# Altium footprint library Kon_Tipk.PCBLIB: 113 footprints (part 4 of 8)
Each footprint in its own frame and in the unit in brackets; x right, y up, seen from the top. Pads: shape width x height; smd on the part's side, far side on the other; paste and mask are expansions set on the pad; w line width, h text height; cw(c..) or ccw(c..) is an arc to the next point about the centre after c.
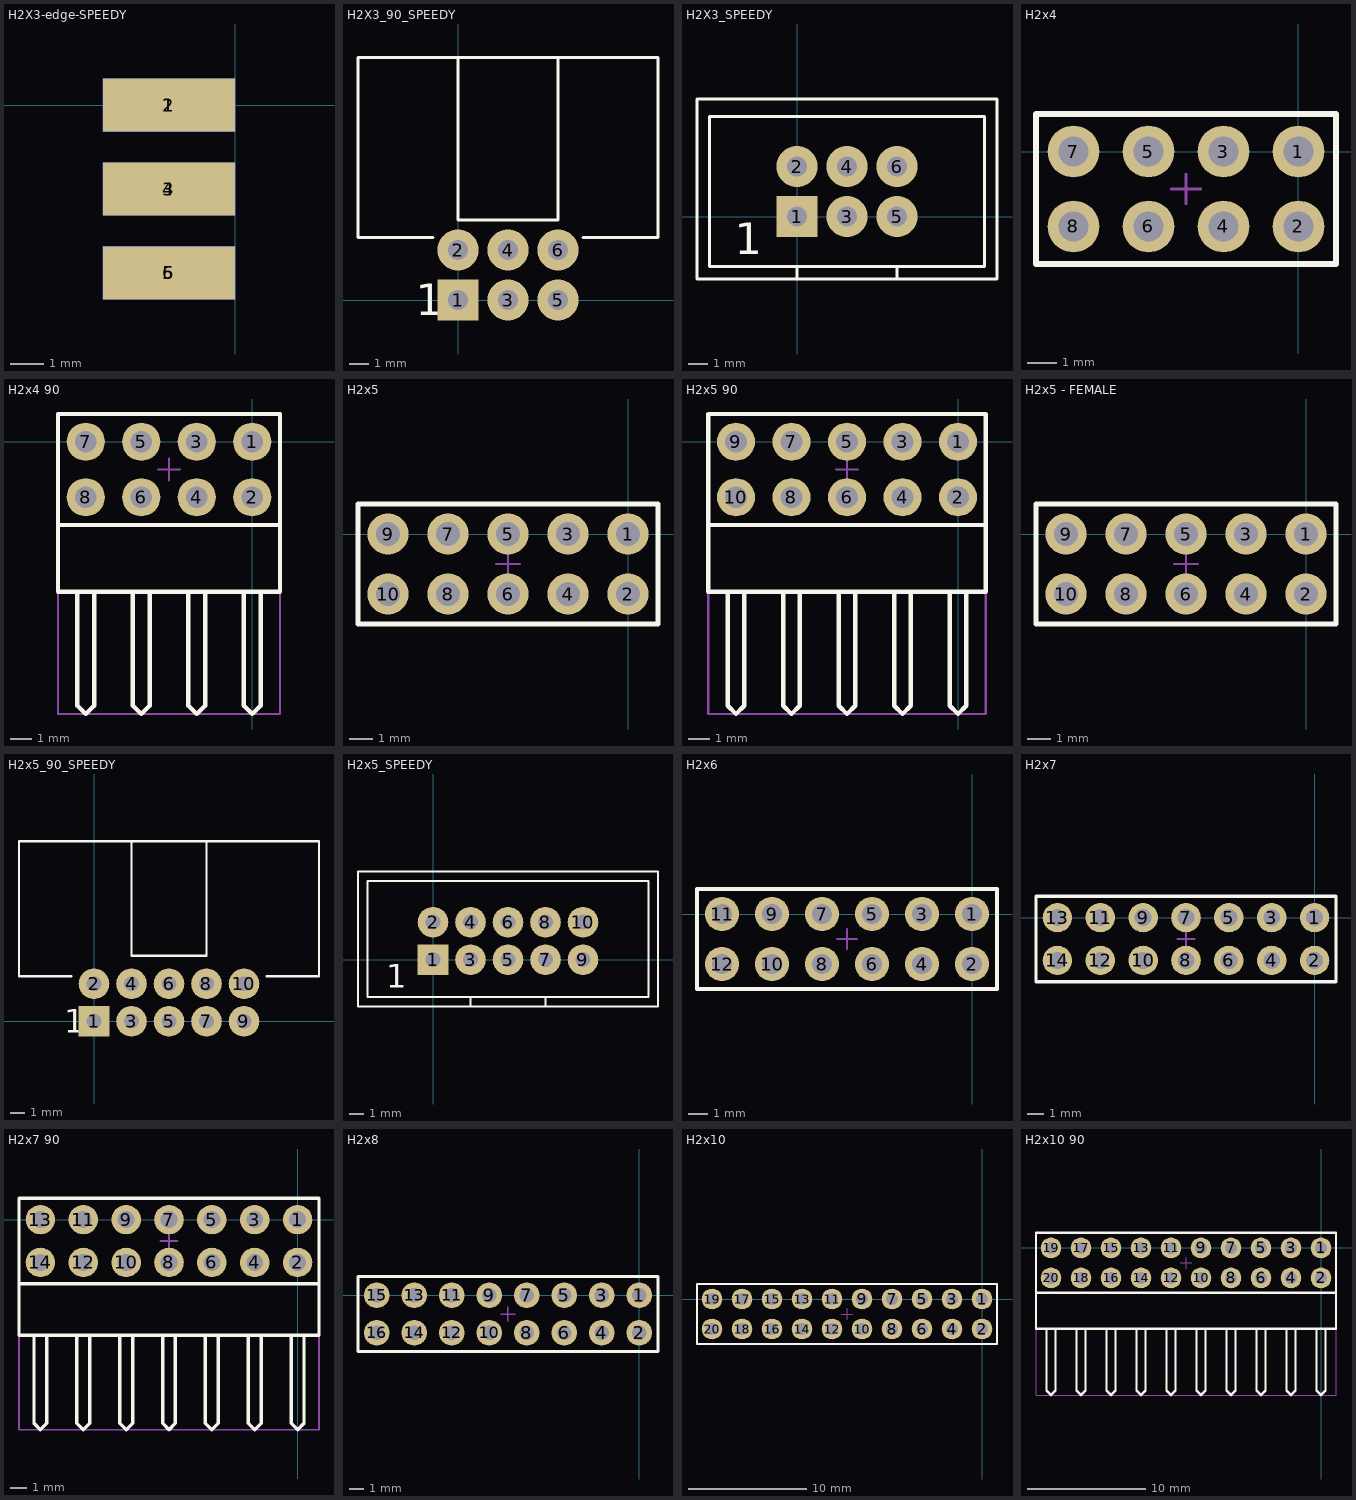
[diagram p3: the footprints below, top view; thin cyan lines are the x and y axes]

## H2X3-edge-SPEEDY [mm]
pads (6):
  rect 4x1.6 smd: 1(-2,0) 3(-2,-2.54) 5(-2,-5.08)
  rect 4x1.6 smd far side: 2(-2,0) 4(-2,-2.54) 6(-2,-5.08)
3D body "0918_SEK_low_profile_male_header_straight_6-pin_2_9_PCB.stp": height 3.52, standoff -5.68, extent -3.633,-10.16 9.017,5.08

## H2X3_90_SPEEDY [mil]
pads (6):
  rect 82x82 hole 39.37: 1(0,0)
  round 82 hole 39.37: 2(0,100) 3(100,0) 4(100,100) 5(200,0) 6(200,100)
Top Overlay:
  lines w5.91: -50,125 -200,125 -200,485 400,485 400,125 250,125 ; 0,485 0,160 200,160 200,485
  text "1" at -85,-30 h62.5
3D body "0918_SEK_low_profile_male_header_angled_6-pin_2_9_PCB.stp": height 362.2, standoff -125.98, extent -200,-15 400,477.91

## H2X3_SPEEDY [mil]
pads (6):
  rect 82x82 hole 39.37: 1(0,0)
  round 82 hole 39.37: 2(0,100) 3(100,0) 4(100,100) 5(200,0) 6(200,100)
Top Overlay:
  lines w5.91: 0,-125 0,-100 ; 200,-125 200,-100 ; -200,-125 400,-125 400,235 -200,235 -200,-125 ; -175,-100 375,-100 375,200 -175,200 -175,-100
  text "1" at -125,-75 h62.5
3D body "0918_SEK_low_profile_male_header_straight_6-pin_2_9_PCB.stp": height 372.05, standoff -125.98, extent -200,-125 400,237.2

## H2x4 [mm]
height 8
pads (8):
  round 1.75 hole 1: 1(0,0) 2(0,-2.54) 3(-2.54,0) 4(-2.54,-2.54) 5(-5.08,0) 6(-5.08,-2.54) 7(-7.62,0) 8(-7.62,-2.54)
Top Overlay:
  lines w0.2: -8.89,-3.81 1.27,-3.81 1.27,1.27 -8.89,1.27 -8.89,-3.81
Mechanical 13:
  lines w0.1: -8.89,-3.81 1.27,-3.81 1.27,1.27 -8.89,1.27 -8.89,-3.81
Top Courtyard:
  lines w0.1: -4.31,-1.27 -3.31,-1.27 ; -3.81,-1.77 -3.81,-0.77 ; -8.89,-3.81 -8.89,1.27 1.27,1.27 1.27,-3.81 -8.89,-3.81
3D body "Samtec-TSW-101-07-G-D.step": height 8.4, standoff -2.52, extent -8.89,-3.81 -6.35,1.27
3D body "Samtec-TSW-101-07-G-D.step": height 8.4, standoff -2.52, extent -1.27,-3.81 1.27,1.27
3D body "Samtec-TSW-101-07-G-D.step": height 8.4, standoff -2.52, extent -6.35,-3.81 -3.81,1.27
3D body "Samtec-TSW-101-07-G-D.step": height 8.4, standoff -2.52, extent -3.81,-3.81 -1.27,1.27

## H2x4 90 [mm]
height 8
pads (8):
  round 1.75 hole 1: 1(0,0) 2(0,-2.54) 3(-2.54,0) 4(-2.54,-2.54) 5(-5.08,0) 6(-5.08,-2.54) 7(-7.62,0) 8(-7.62,-2.54)
Top Overlay:
  lines w0.2: -8.89,-3.81 1.27,-3.81 ; -8.001,-6.858 -8.001,-12.078 -7.62,-12.459 -7.239,-12.078 -7.239,-6.858 ; -5.461,-6.858 -5.461,-12.078 -5.08,-12.459 -4.699,-12.078 -4.699,-6.858 ; -2.921,-6.858 -2.921,-12.078 -2.54,-12.459 -2.159,-12.078 -2.159,-6.858 ; -0.381,-6.858 -0.381,-12.078 0,-12.459 0.381,-12.078 0.381,-6.858 ; -8.89,-6.858 1.27,-6.858 1.27,1.27 -8.89,1.27 -8.89,-6.858
Mechanical 13:
  lines w0.1: -8.89,-12.459 1.27,-12.459 1.27,1.27 -8.89,1.27 -8.89,-12.459
Top Courtyard:
  lines w0.1: -4.31,-1.27 -3.31,-1.27 ; -3.81,-1.77 -3.81,-0.77 ; -8.89,-12.459 1.27,-12.459 1.27,1.27 -8.89,1.27 -8.89,-12.459
3D body "Samtec-TSW-101-08-G-D-RA.step": height 5.6, standoff -2.27, extent -3.81,-12.459 -1.27,0.305
3D body "Samtec-TSW-101-08-G-D-RA.step": height 5.6, standoff -2.27, extent -1.27,-12.459 1.27,0.305
3D body "Samtec-TSW-101-08-G-D-RA.step": height 5.6, standoff -2.27, extent -6.35,-12.459 -3.81,0.305
3D body "Samtec-TSW-101-08-G-D-RA.step": height 5.6, standoff -2.27, extent -8.89,-12.459 -6.35,0.305

## H2x5 [mm]
height 8
pads (10):
  round 1.75 hole 1: 1(0,0) 2(0,-2.54) 3(-2.54,0) 4(-2.54,-2.54) 5(-5.08,0) 6(-5.08,-2.54) 7(-7.62,0) 8(-7.62,-2.54) 9(-10.16,0) 10(-10.16,-2.54)
Top Overlay:
  lines w0.2: -11.43,-3.81 -11.43,1.27 1.27,1.27 1.27,-3.81 -11.43,-3.81
Mechanical 13:
  lines w0.1: -11.43,-3.81 -11.43,1.27 1.27,1.27 1.27,-3.81 -11.43,-3.81
Top Courtyard:
  lines w0.1: -5.58,-1.27 -4.58,-1.27 ; -5.08,-1.77 -5.08,-0.77 ; -11.43,-3.81 1.27,-3.81 1.27,1.27 -11.43,1.27 -11.43,-3.81
3D body "Samtec-TSW-101-07-G-D.step": height 8.4, standoff -2.52, extent -3.81,-3.81 -1.27,1.27
3D body "Samtec-TSW-101-07-G-D.step": height 8.4, standoff -2.52, extent -6.35,-3.81 -3.81,1.27
3D body "Samtec-TSW-101-07-G-D.step": height 8.4, standoff -2.52, extent -1.27,-3.81 1.27,1.27
3D body "Samtec-TSW-101-07-G-D.step": height 8.4, standoff -2.52, extent -8.89,-3.81 -6.35,1.27
3D body "Samtec-TSW-101-07-G-D.step": height 8.4, standoff -2.52, extent -11.43,-3.81 -8.89,1.27

## H2x5 90 [mm]
height 8
pads (10):
  round 1.75 hole 1: 1(0,0) 2(0,-2.54) 3(-2.54,0) 4(-2.54,-2.54) 5(-5.08,0) 6(-5.08,-2.54) 7(-7.62,0) 8(-7.62,-2.54) 9(-10.16,0) 10(-10.16,-2.54)
Top Overlay:
  lines w0.2: -11.43,-3.81 1.27,-3.81 ; -10.541,-6.858 -10.541,-12.078 -10.16,-12.459 -9.779,-12.078 -9.779,-6.858 ; -8.001,-6.858 -8.001,-12.078 -7.62,-12.459 -7.239,-12.078 -7.239,-6.858 ; -5.461,-6.858 -5.461,-12.078 -5.08,-12.459 -4.699,-12.078 -4.699,-6.858 ; -2.921,-6.858 -2.921,-12.078 -2.54,-12.459 -2.159,-12.078 -2.159,-6.858 ; -0.381,-6.858 -0.381,-12.078 0,-12.459 0.381,-12.078 0.381,-6.858 ; -11.43,-6.858 -11.43,1.27 1.27,1.27 1.27,-6.858 -11.43,-6.858
Mechanical 13:
  lines w0.1: -11.43,-12.459 -11.43,1.27 1.27,1.27 1.27,-12.459 -11.43,-12.459
Top Courtyard:
  lines w0.1: -5.58,-1.27 -4.58,-1.27 ; -5.08,-1.77 -5.08,-0.77 ; -11.43,-12.459 -11.43,1.27 1.27,1.27 1.27,-12.459 -11.43,-12.459
3D body "Samtec-TSW-101-08-G-D-RA.step": height 5.6, standoff -2.27, extent -11.43,-12.459 -8.89,0.305
3D body "Samtec-TSW-101-08-G-D-RA.step": height 5.6, standoff -2.27, extent -8.89,-12.459 -6.35,0.305
3D body "Samtec-TSW-101-08-G-D-RA.step": height 5.6, standoff -2.27, extent -6.35,-12.459 -3.81,0.305
3D body "Samtec-TSW-101-08-G-D-RA.step": height 5.6, standoff -2.27, extent -1.27,-12.459 1.27,0.305
3D body "Samtec-TSW-101-08-G-D-RA.step": height 5.6, standoff -2.27, extent -3.81,-12.459 -1.27,0.305

## H2x5 - FEMALE [mm]
height 8
pads (10):
  round 1.75 hole 1: 1(0,0) 2(0,-2.54) 3(-2.54,0) 4(-2.54,-2.54) 5(-5.08,0) 6(-5.08,-2.54) 7(-7.62,0) 8(-7.62,-2.54) 9(-10.16,0) 10(-10.16,-2.54)
Top Overlay:
  lines w0.2: -11.43,-3.81 -11.43,1.27 1.27,1.27 1.27,-3.81 -11.43,-3.81
Mechanical 13:
  lines w0.1: -11.43,-3.81 -11.43,1.27 1.27,1.27 1.27,-3.81 -11.43,-3.81
Top Courtyard:
  lines w0.1: -5.58,-1.27 -4.58,-1.27 ; -5.08,-1.77 -5.08,-0.77 ; -11.43,-3.81 1.27,-3.81 1.27,1.27 -11.43,1.27 -11.43,-3.81
3D body "User Library-Header_fem_2x5.step": height 8.5, standoff -3, extent -11.43,-3.77 1.27,1.23

## H2x5_90_SPEEDY [mil]
pads (10):
  rect 82x82 hole 39.37: 1(0,0)
  round 82 hole 39.37: 2(0,100) 3(100,0) 4(100,100) 5(200,0) 6(200,100) 7(300,0) 8(300,100) 9(400,0) 10(400,100)
Top Overlay:
  lines w5.91: -60,120 -200,120 -200,480 600,480 600,120 460,120 ; 100,480 100,175 300,175 300,480
  text "1" at -80,-30 h62.5
3D body "0918_SEK_low_profile_male_header_angled_10-pin_2_9_PCB.stp": height 362.2, standoff -125.98, extent -200,-11.46 600,481.46

## H2x5_SPEEDY [mil]
pads (10):
  rect 82x82 hole 39.37: 1(0,0)
  round 82 hole 39.37: 2(0,100) 3(100,0) 4(100,100) 5(200,0) 6(200,100) 7(300,0) 8(300,100) 9(400,0) 10(400,100)
Top Overlay:
  lines w5.91: 100,-125 100,-100 ; 300,-125 300,-100 ; -200,-125 600,-125 600,235 -200,235 -200,-125 ; -175,-100 575,-100 575,210 -175,210 -175,-100
  text "1" at -125,-75 h62.5
3D body "0918_SEK_low_profile_male_header_straight_10-pin_2_9_PCB.stp": height 372.05, standoff -125.98, extent -200,-126.1 600,236.1

## H2x6 [mm]
height 8
pads (12):
  round 1.75 hole 1: 1(0,0) 2(0,-2.54) 3(-2.54,0) 4(-2.54,-2.54) 5(-5.08,0) 6(-5.08,-2.54) 7(-7.62,0) 8(-7.62,-2.54) 9(-10.16,0) 10(-10.16,-2.54) 11(-12.7,0) 12(-12.7,-2.54)
Top Overlay:
  lines w0.2: -13.97,-3.81 -13.97,1.27 1.27,1.27 1.27,-3.81 -13.97,-3.81
Mechanical 13:
  lines w0.1: -13.97,-3.81 -13.97,1.27 1.27,1.27 1.27,-3.81 -13.97,-3.81
Top Courtyard:
  lines w0.1: -6.85,-1.27 -5.85,-1.27 ; -6.35,-1.77 -6.35,-0.77 ; -13.97,-3.81 1.27,-3.81 1.27,1.27 -13.97,1.27 -13.97,-3.81
3D body "Samtec-TSW-101-07-G-D.step": height 8.4, standoff -2.52, extent -3.81,-3.81 -1.27,1.27
3D body "Samtec-TSW-101-07-G-D.step": height 8.4, standoff -2.52, extent -6.35,-3.81 -3.81,1.27
3D body "Samtec-TSW-101-07-G-D.step": height 8.4, standoff -2.52, extent -1.27,-3.81 1.27,1.27
3D body "Samtec-TSW-101-07-G-D.step": height 8.4, standoff -2.52, extent -8.89,-3.81 -6.35,1.27
3D body "Samtec-TSW-101-07-G-D.step": height 8.4, standoff -2.52, extent -11.43,-3.81 -8.89,1.27
3D body "Samtec-TSW-101-07-G-D.step": height 8.4, standoff -2.52, extent -13.97,-3.81 -11.43,1.27

## H2x7 [mm]
height 8
pads (14):
  round 1.75 hole 1: 1(0,0) 2(0,-2.54) 3(-2.54,0) 4(-2.54,-2.54) 5(-5.08,0) 6(-5.08,-2.54) 7(-7.62,0) 8(-7.62,-2.54) 9(-10.16,0) 10(-10.16,-2.54) 11(-12.7,0) 12(-12.7,-2.54) 13(-15.24,0) 14(-15.24,-2.54)
Top Overlay:
  lines w0.2: -16.51,-3.81 -16.51,1.27 1.27,1.27 1.27,-3.81 -16.51,-3.81
Mechanical 13:
  lines w0.1: -16.51,-3.81 -16.51,1.27 1.27,1.27 1.27,-3.81 -16.51,-3.81
Top Courtyard:
  lines w0.1: -8.12,-1.27 -7.12,-1.27 ; -7.62,-1.77 -7.62,-0.77 ; -16.51,-3.81 1.27,-3.81 1.27,1.27 -16.51,1.27 -16.51,-3.81
3D body "Samtec-TSW-101-07-G-D.step": height 8.4, standoff -2.52, extent -3.81,-3.81 -1.27,1.27
3D body "Samtec-TSW-101-07-G-D.step": height 8.4, standoff -2.52, extent -6.35,-3.81 -3.81,1.27
3D body "Samtec-TSW-101-07-G-D.step": height 8.4, standoff -2.52, extent -1.27,-3.81 1.27,1.27
3D body "Samtec-TSW-101-07-G-D.step": height 8.4, standoff -2.52, extent -8.89,-3.81 -6.35,1.27
3D body "Samtec-TSW-101-07-G-D.step": height 8.4, standoff -2.52, extent -11.43,-3.81 -8.89,1.27
3D body "Samtec-TSW-101-07-G-D.step": height 8.4, standoff -2.52, extent -13.97,-3.81 -11.43,1.27
3D body "Samtec-TSW-101-07-G-D.step": height 8.4, standoff -2.52, extent -16.51,-3.81 -13.97,1.27

## H2x7 90 [mm]
height 8
pads (14):
  round 1.75 hole 1: 1(0,0) 2(0,-2.54) 3(-2.54,0) 4(-2.54,-2.54) 5(-5.08,0) 6(-5.08,-2.54) 7(-7.62,0) 8(-7.62,-2.54) 9(-10.16,0) 10(-10.16,-2.54) 11(-12.7,0) 12(-12.7,-2.54) 13(-15.24,0) 14(-15.24,-2.54)
Top Overlay:
  lines w0.2: -16.51,-3.81 1.27,-3.81 ; -15.621,-6.858 -15.621,-12.078 -15.24,-12.459 -14.859,-12.078 -14.859,-6.858 ; -13.081,-6.858 -13.081,-12.078 -12.7,-12.459 -12.319,-12.078 -12.319,-6.858 ; -10.541,-6.858 -10.541,-12.078 -10.16,-12.459 -9.779,-12.078 -9.779,-6.858 ; -8.001,-6.858 -8.001,-12.078 -7.62,-12.459 -7.239,-12.078 -7.239,-6.858 ; -5.461,-6.858 -5.461,-12.078 -5.08,-12.459 -4.699,-12.078 -4.699,-6.858 ; -2.921,-6.858 -2.921,-12.078 -2.54,-12.459 -2.159,-12.078 -2.159,-6.858 ; -0.381,-6.858 -0.381,-12.078 0,-12.459 0.381,-12.078 0.381,-6.858 ; -16.51,-6.858 1.27,-6.858 1.27,1.27 -16.51,1.27 -16.51,-6.858
Mechanical 13:
  lines w0.1: -16.51,-12.459 1.27,-12.459 1.27,1.27 -16.51,1.27 -16.51,-12.459
Top Courtyard:
  lines w0.1: -8.12,-1.27 -7.12,-1.27 ; -7.62,-1.77 -7.62,-0.77 ; -16.51,-12.459 1.27,-12.459 1.27,1.27 -16.51,1.27 -16.51,-12.459
3D body "Samtec-TSW-101-08-G-D-RA.step": height 5.6, standoff -2.27, extent -3.81,-12.459 -1.27,0.305
3D body "Samtec-TSW-101-08-G-D-RA.step": height 5.6, standoff -2.27, extent -1.27,-12.459 1.27,0.305
3D body "Samtec-TSW-101-08-G-D-RA.step": height 5.6, standoff -2.27, extent -6.35,-12.459 -3.81,0.305
3D body "Samtec-TSW-101-08-G-D-RA.step": height 5.6, standoff -2.27, extent -8.89,-12.459 -6.35,0.305
3D body "Samtec-TSW-101-08-G-D-RA.step": height 5.6, standoff -2.27, extent -11.43,-12.459 -8.89,0.305
3D body "Samtec-TSW-101-08-G-D-RA.step": height 5.6, standoff -2.27, extent -13.97,-12.459 -11.43,0.305
3D body "Samtec-TSW-101-08-G-D-RA.step": height 5.6, standoff -2.27, extent -16.51,-12.459 -13.97,0.305

## H2x8 [mm]
height 8
pads (16):
  round 1.75 hole 1: 1(0,0) 2(0,-2.54) 3(-2.54,0) 4(-2.54,-2.54) 5(-5.08,0) 6(-5.08,-2.54) 7(-7.62,0) 8(-7.62,-2.54) 9(-10.16,0) 10(-10.16,-2.54) 11(-12.7,0) 12(-12.7,-2.54) 13(-15.24,0) 14(-15.24,-2.54) 15(-17.78,0) 16(-17.78,-2.54)
Top Overlay:
  lines w0.2: -19.05,-3.81 -19.05,1.27 1.27,1.27 1.27,-3.81 -19.05,-3.81
Mechanical 13:
  lines w0.1: -19.05,-3.81 -19.05,1.27 1.27,1.27 1.27,-3.81 -19.05,-3.81
Top Courtyard:
  lines w0.1: -9.39,-1.27 -8.39,-1.27 ; -8.89,-1.77 -8.89,-0.77 ; -19.05,-3.81 1.27,-3.81 1.27,1.27 -19.05,1.27 -19.05,-3.81
3D body "Samtec-TSW-101-07-G-D.step": height 8.4, standoff -2.52, extent -3.81,-3.81 -1.27,1.27
3D body "Samtec-TSW-101-07-G-D.step": height 8.4, standoff -2.52, extent -6.35,-3.81 -3.81,1.27
3D body "Samtec-TSW-101-07-G-D.step": height 8.4, standoff -2.52, extent -1.27,-3.81 1.27,1.27
3D body "Samtec-TSW-101-07-G-D.step": height 8.4, standoff -2.52, extent -8.89,-3.81 -6.35,1.27
3D body "Samtec-TSW-101-07-G-D.step": height 8.4, standoff -2.52, extent -11.43,-3.81 -8.89,1.27
3D body "Samtec-TSW-101-07-G-D.step": height 8.4, standoff -2.52, extent -13.97,-3.81 -11.43,1.27
3D body "Samtec-TSW-101-07-G-D.step": height 8.4, standoff -2.52, extent -19.05,-3.81 -16.51,1.27
3D body "Samtec-TSW-101-07-G-D.step": height 8.4, standoff -2.52, extent -16.51,-3.81 -13.97,1.27

## H2x10 [mm]
height 8
pads (20):
  round 1.75 hole 1: 1(0,0) 2(0,-2.54) 3(-2.54,0) 4(-2.54,-2.54) 5(-5.08,0) 6(-5.08,-2.54) 7(-7.62,0) 8(-7.62,-2.54) 9(-10.16,0) 10(-10.16,-2.54) 11(-12.7,0) 12(-12.7,-2.54) 13(-15.24,0) 14(-15.24,-2.54) 15(-17.78,0) 16(-17.78,-2.54) 17(-20.32,0) 18(-20.32,-2.54) 19(-22.86,0) 20(-22.86,-2.54)
Top Overlay:
  lines w0.2: -24.13,-3.81 -24.13,1.27 1.27,1.27 1.27,-3.81 -24.13,-3.81
Mechanical 13:
  lines w0.1: -24.13,-3.81 -24.13,1.27 1.27,1.27 1.27,-3.81 -24.13,-3.81
Top Courtyard:
  lines w0.1: -11.93,-1.27 -10.93,-1.27 ; -11.43,-1.77 -11.43,-0.77 ; -24.13,-3.81 1.27,-3.81 1.27,1.27 -24.13,1.27 -24.13,-3.81
3D body "Samtec-TSW-101-07-G-D.step": height 8.4, standoff -2.52, extent -3.81,-3.81 -1.27,1.27
3D body "Samtec-TSW-101-07-G-D.step": height 8.4, standoff -2.52, extent -6.35,-3.81 -3.81,1.27
3D body "Samtec-TSW-101-07-G-D.step": height 8.4, standoff -2.52, extent -1.27,-3.81 1.27,1.27
3D body "Samtec-TSW-101-07-G-D.step": height 8.4, standoff -2.52, extent -8.89,-3.81 -6.35,1.27
3D body "Samtec-TSW-101-07-G-D.step": height 8.4, standoff -2.52, extent -11.43,-3.81 -8.89,1.27
3D body "Samtec-TSW-101-07-G-D.step": height 8.4, standoff -2.52, extent -13.97,-3.81 -11.43,1.27
3D body "Samtec-TSW-101-07-G-D.step": height 8.4, standoff -2.52, extent -16.51,-3.81 -13.97,1.27
3D body "Samtec-TSW-101-07-G-D.step": height 8.4, standoff -2.52, extent -19.05,-3.81 -16.51,1.27
3D body "Samtec-TSW-101-07-G-D.step": height 8.4, standoff -2.52, extent -21.59,-3.81 -19.05,1.27
3D body "Samtec-TSW-101-07-G-D.step": height 8.4, standoff -2.52, extent -24.13,-3.81 -21.59,1.27

## H2x10 90 [mm]
height 8
pads (20):
  round 1.75 hole 1: 1(0,0) 2(0,-2.54) 3(-2.54,0) 4(-2.54,-2.54) 5(-5.08,0) 6(-5.08,-2.54) 7(-7.62,0) 8(-7.62,-2.54) 9(-10.16,0) 10(-10.16,-2.54) 11(-12.7,0) 12(-12.7,-2.54) 13(-15.24,0) 14(-15.24,-2.54) 15(-17.78,0) 16(-17.78,-2.54) 17(-20.32,0) 18(-20.32,-2.54) 19(-22.86,0) 20(-22.86,-2.54)
Top Overlay:
  lines w0.2: -24.13,-3.81 1.27,-3.81 ; -23.241,-6.858 -23.241,-12.078 -22.86,-12.459 -22.479,-12.078 -22.479,-6.858 ; -20.701,-6.858 -20.701,-12.078 -20.32,-12.459 -19.939,-12.078 -19.939,-6.858 ; -18.161,-6.858 -18.161,-12.078 -17.78,-12.459 -17.399,-12.078 -17.399,-6.858 ; -15.621,-6.858 -15.621,-12.078 -15.24,-12.459 -14.859,-12.078 -14.859,-6.858 ; -13.081,-6.858 -13.081,-12.078 -12.7,-12.459 -12.319,-12.078 -12.319,-6.858 ; -10.541,-6.858 -10.541,-12.078 -10.16,-12.459 -9.779,-12.078 -9.779,-6.858 ; -8.001,-6.858 -8.001,-12.078 -7.62,-12.459 -7.239,-12.078 -7.239,-6.858 ; -5.461,-6.858 -5.461,-12.078 -5.08,-12.459 -4.699,-12.078 -4.699,-6.858 ; -2.921,-6.858 -2.921,-12.078 -2.54,-12.459 -2.159,-12.078 -2.159,-6.858 ; -0.381,-6.858 -0.381,-12.078 0,-12.459 0.381,-12.078 0.381,-6.858 ; -24.13,-6.858 -24.13,1.27 1.27,1.27 1.27,-6.858 -24.13,-6.858
Mechanical 13:
  lines w0.1: -24.13,-12.459 -24.13,1.27 1.27,1.27 1.27,-12.459 -24.13,-12.459
Top Courtyard:
  lines w0.1: -11.93,-1.27 -10.93,-1.27 ; -11.43,-1.77 -11.43,-0.77 ; -24.13,-12.459 -24.13,1.27 1.27,1.27 1.27,-12.459 -24.13,-12.459
3D body "Samtec-TSW-101-08-G-D-RA.step": height 5.6, standoff -2.27, extent -24.13,-12.459 -21.59,0.305
3D body "Samtec-TSW-101-08-G-D-RA.step": height 5.6, standoff -2.27, extent -21.59,-12.459 -19.05,0.305
3D body "Samtec-TSW-101-08-G-D-RA.step": height 5.6, standoff -2.27, extent -19.05,-12.459 -16.51,0.305
3D body "Samtec-TSW-101-08-G-D-RA.step": height 5.6, standoff -2.27, extent -16.51,-12.459 -13.97,0.305
3D body "Samtec-TSW-101-08-G-D-RA.step": height 5.6, standoff -2.27, extent -13.97,-12.459 -11.43,0.305
3D body "Samtec-TSW-101-08-G-D-RA.step": height 5.6, standoff -2.27, extent -11.43,-12.459 -8.89,0.305
3D body "Samtec-TSW-101-08-G-D-RA.step": height 5.6, standoff -2.27, extent -8.89,-12.459 -6.35,0.305
3D body "Samtec-TSW-101-08-G-D-RA.step": height 5.6, standoff -2.27, extent -6.35,-12.459 -3.81,0.305
3D body "Samtec-TSW-101-08-G-D-RA.step": height 5.6, standoff -2.27, extent -1.27,-12.459 1.27,0.305
3D body "Samtec-TSW-101-08-G-D-RA.step": height 5.6, standoff -2.27, extent -3.81,-12.459 -1.27,0.305